# Altium schematic symbol library IC_ADI.SCHLIB: 3169 symbols (part 131 of 181)
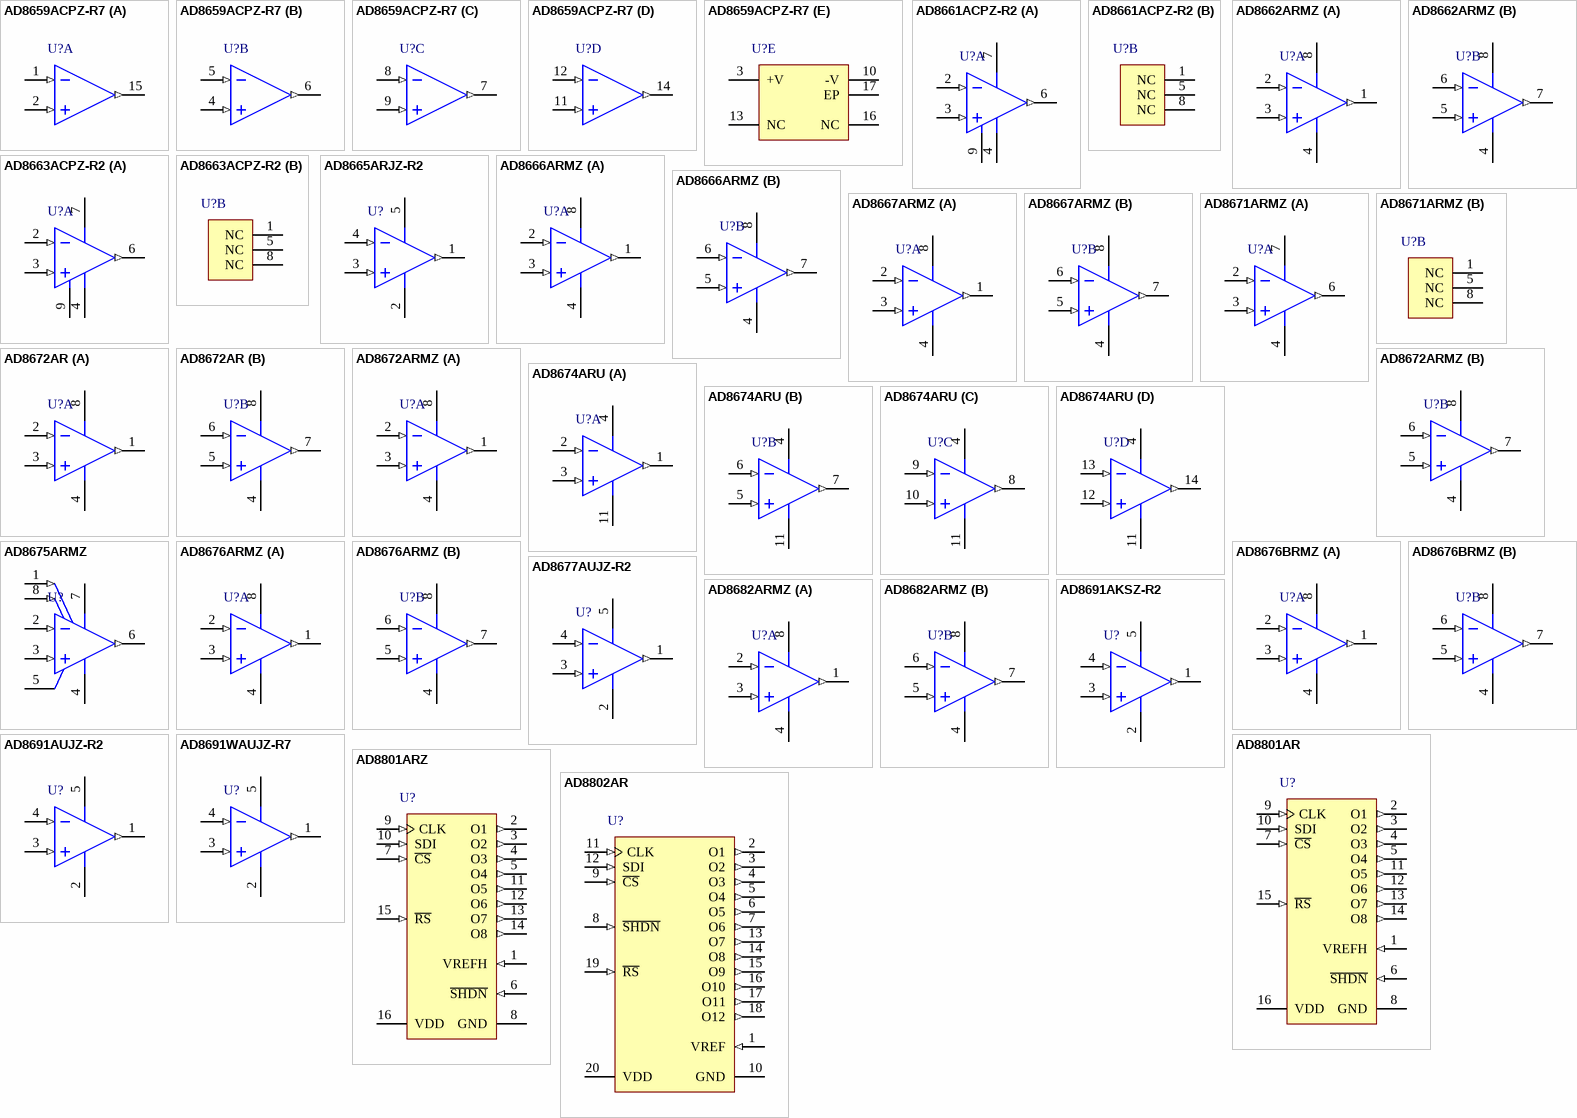
[diagram p321: symbols AD8659ACPZ-R7 to AD8802AR]

## AD8802AR
designator U?
Dual 8-Bit MDAC with Power Shutdown, -40 to +85 degC, RW-20, Tube; Generic Part Number: AD8802; PartNumber: AD8802AR; # DAC Outputs: 12; Max V+: 5.5V; Op Pwr Diss: 20mW; Resolution (Bits): 8; Settling Time: 600ns; Single Supply: Yes; DatasheetVersion: Rev.0; PackageVersion: 060706-A; PackageReference: RW-20; PackageDescription: 20-Lead Standard Small Outline Package [SOIC_W] Wide Body; Supplier Part Number 1: AD8802AR-ND; Supplier Part Number 2: 584-AD8802AR; Packing: Tube; RoHS: N; Mounting Technology: Surface Mount; Code_JEDEC: MS-013-AC; ComponentLink1Description: Manufacturer URL; ComponentLink2Description: Datasheet; ComponentLink3Description: Package Specification; ComponentLink4Description: Product URL
footprint SOIC20W_1.27 (Footprint not found)
pins: 1 VREF (in) "Common DAC Reference Input", 2 O1 (out) "DAC Output #1, addr = 0000", 3 O2 (out) "DAC Output #2, addr = 0001", 4 O3 (out) "DAC Output #3, addr = 0010", 5 O4 (out) "DAC Output #4, addr = 0011", 6 O5 (out) "DAC Output #5, addr = 0100", 7 O6 (out) "DAC Output #6, addr = 0101", 8 ~{SHDN} (in) "Reference input current goes to zero. DAC latch settings maintained", 9 ~{CS} (in) "Chip Select Input, Active Low. When C\S\ returns high, data in the serial input register is decoded based on the address bits and loaded into the target DAC register", 10 GND (power) "Ground", 11 CLK (in) "Serial Clock Input, Positive Edge Triggered", 12 SDI (in) "Serial Data Input", 13 O7 (out) "DAC Output #7, addr = 0110", 14 O8 (out) "DAC Output #8, addr = 0111", 15 O9 (out) "DAC Output #9, addr = 1000", 16 O10 (out) "DAC Output #10, addr = 1001", 17 O11 (out) "DAC Output #11, addr = 1010", 18 O12 (out) "DAC Output #12, addr = 1011", 19 ~{RS} (in) "Asynchronous Preset to Midscale Output Setting. Loads all DAC Registers with 80H", 20 VDD (power) "Positive Power Supply, Specified for Operation at Both +3 V and +5 V"

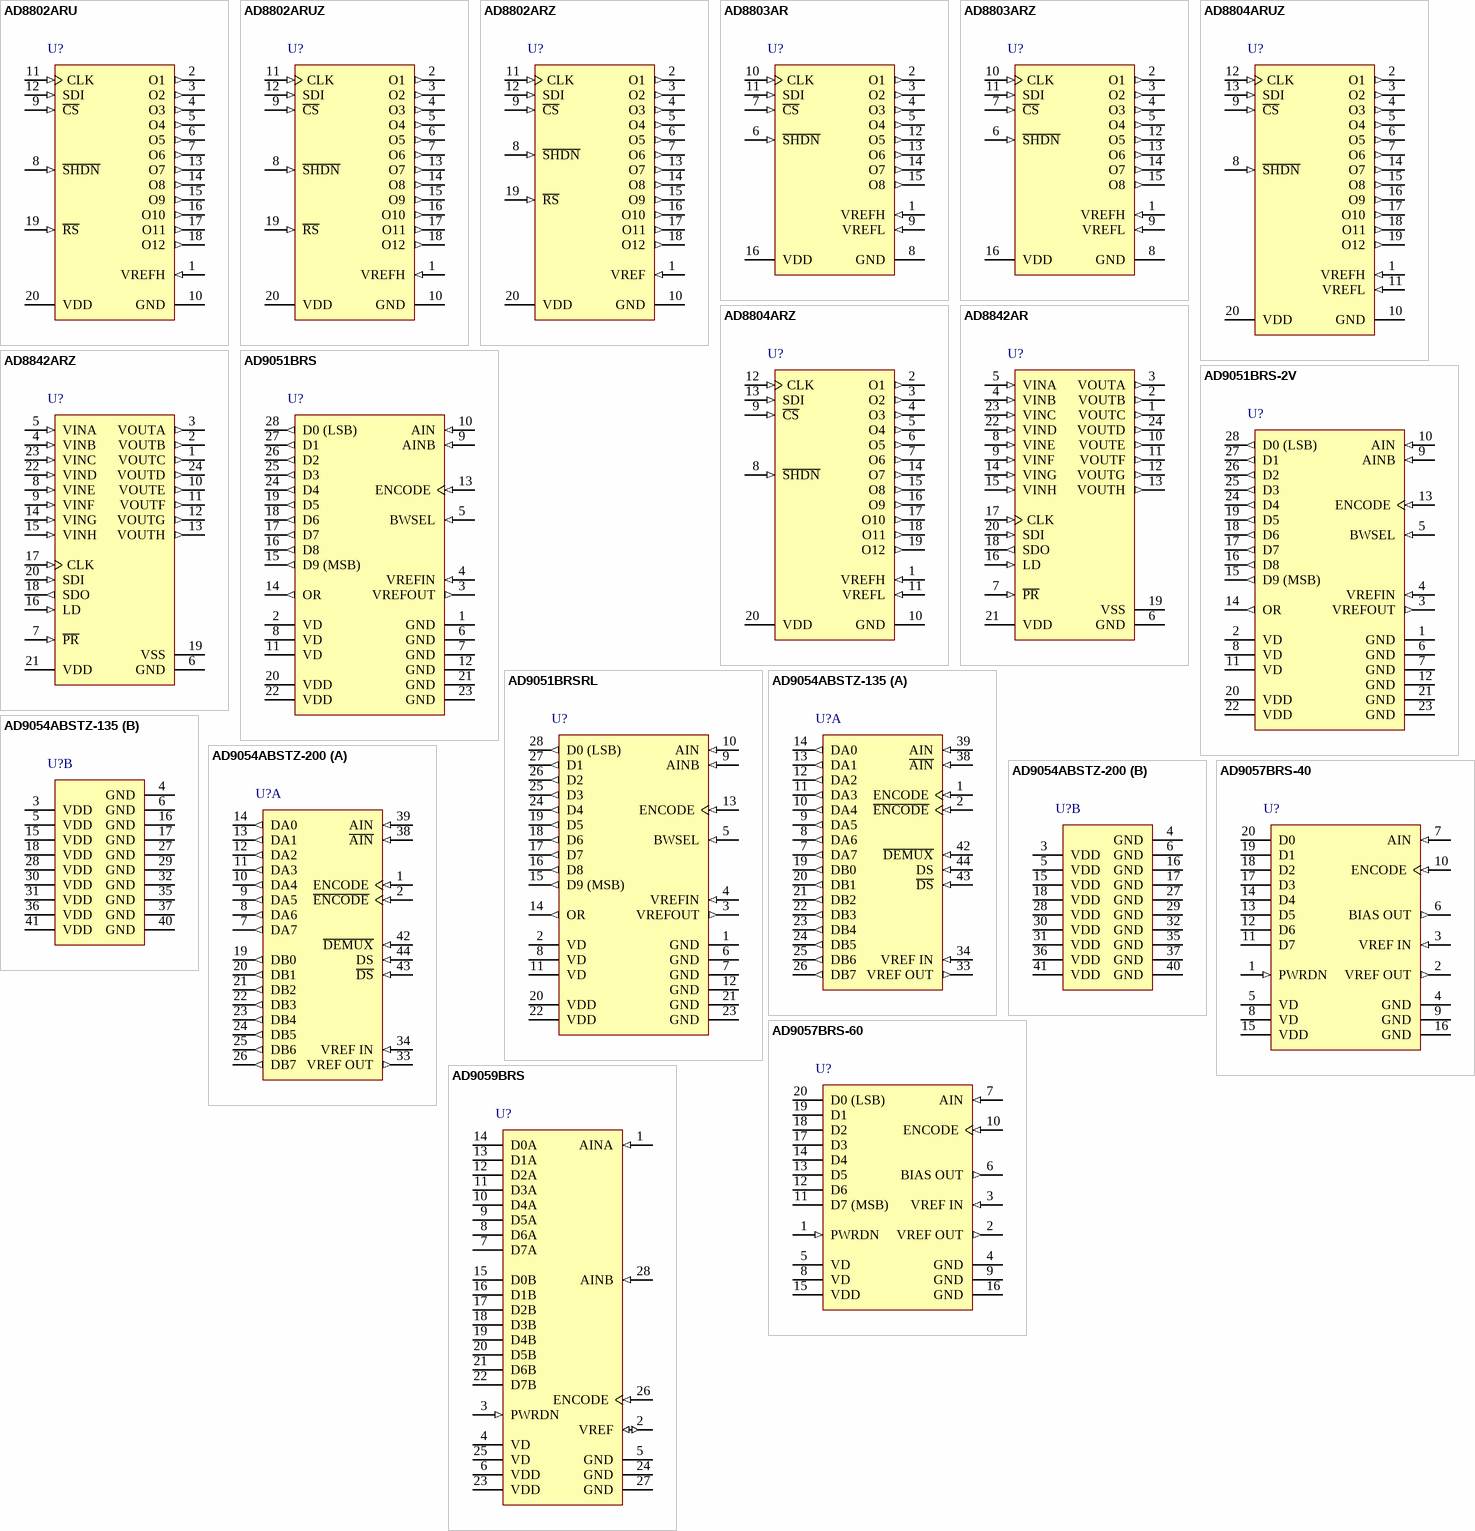
[diagram p101: symbols AD8802ARU to AD9059BRS]

## AD8802ARU
designator U?
Dual 8-Bit MDAC with Power Shutdown, -40 to +85 degC, RU-20, Tube; Generic Part Number: AD8802; PartNumber: AD8802ARU; # DAC Outputs: 12; Max V+: 5.5V; Op Pwr Diss: 20mW; Resolution (Bits): 8; Settling Time: 600ns; Single Supply: Yes; DatasheetVersion: Rev.0; PackageVersion: 2000; PackageReference: RU-20; PackageDescription: 20-Lead Thin Shrink Small Outline Package [TSSOP]; Supplier Part Number 1: AD8802ARU-ND; Supplier Part Number 2: 584-AD8802ARU; Packing: Tube; RoHS: N; Mounting Technology: Surface Mount; Code_JEDEC: MO-153AC; ComponentLink1Description: Manufacturer URL; ComponentLink2Description: Datasheet; ComponentLink3Description: Package Specification; ComponentLink4Description: Product URL
footprint TSSOP20_0.65 (Footprint not found)
pins: 1 VREFH (in) "Common DAC Reference Input", 2 O1 (out) "DAC Output #1, addr = 0000", 3 O2 (out) "DAC Output #2, addr = 0001", 4 O3 (out) "DAC Output #3, addr = 0010", 5 O4 (out) "DAC Output #4, addr = 0011", 6 O5 (out) "DAC Output #5, addr = 0100", 7 O6 (out) "DAC Output #6, addr = 0101", 8 ~{SHDN} (in) "Reference input current goes to zero. DAC latch settings maintained", 9 ~{CS} (in) "Chip Select Input, Active Low. When C\S\ returns high, data in the serial input register is decoded based on the address bits and loaded into the target DAC register", 10 GND (power) "Ground", 11 CLK (in) "Serial Clock Input, Positive Edge Triggered", 12 SDI (in) "Serial Data Input", 13 O7 (out) "DAC Output #7, addr = 0110", 14 O8 (out) "DAC Output #8, addr = 0111", 15 O9 (out) "DAC Output #9, addr = 1000", 16 O10 (out) "DAC Output #10, addr = 1001", 17 O11 (out) "DAC Output #11, addr = 1010", 18 O12 (out) "DAC Output #12, addr = 1011", 19 ~{RS} (in) "Asynchronous Preset to Midscale Output Setting. Loads all DAC Registers with 80H", 20 VDD (power) "Positive Power Supply, Specified for Operation at Both +3 V and +5 V"

## AD8802ARUZ
designator U?
Dual 8-Bit MDAC with Power Shutdown, -40 to +85 degC, RU-20, Pb-Free, Tube; Generic Part Number: AD8802; PartNumber: AD8802ARUZ; # DAC Outputs: 12; Max V+: 5.5V; Op Pwr Diss: 20mW; Resolution (Bits): 8; Settling Time: 600ns; Single Supply: Yes; DatasheetVersion: Rev.0; PackageVersion: 2000; PackageReference: RU-20; PackageDescription: 20-Lead Thin Shrink Small Outline Package [TSSOP]; Supplier Part Number 1: AD8802ARUZ-ND; Supplier Part Number 2: 59K7103; Supplier Part Number 3: 584-AD8802ARUZ; Packing: Tube; RoHS: Y; Mounting Technology: Surface Mount; Code_JEDEC: MO-153AC; ComponentLink1Description: Manufacturer URL; ComponentLink2Description: Datasheet; ComponentLink3Description: Package Specification; ComponentLink4Description: Product URL
footprint TSSOP20_0.65 (Footprint not found)
pins: 1 VREFH (in) "Common DAC Reference Input", 2 O1 (out) "DAC Output #1, addr = 0000", 3 O2 (out) "DAC Output #2, addr = 0001", 4 O3 (out) "DAC Output #3, addr = 0010", 5 O4 (out) "DAC Output #4, addr = 0011", 6 O5 (out) "DAC Output #5, addr = 0100", 7 O6 (out) "DAC Output #6, addr = 0101", 8 ~{SHDN} (in) "Reference input current goes to zero. DAC latch settings maintained", 9 ~{CS} (in) "Chip Select Input, Active Low. When C\S\ returns high, data in the serial input register is decoded based on the address bits and loaded into the target DAC register", 10 GND (power) "Ground", 11 CLK (in) "Serial Clock Input, Positive Edge Triggered", 12 SDI (in) "Serial Data Input", 13 O7 (out) "DAC Output #7, addr = 0110", 14 O8 (out) "DAC Output #8, addr = 0111", 15 O9 (out) "DAC Output #9, addr = 1000", 16 O10 (out) "DAC Output #10, addr = 1001", 17 O11 (out) "DAC Output #11, addr = 1010", 18 O12 (out) "DAC Output #12, addr = 1011", 19 ~{RS} (in) "Asynchronous Preset to Midscale Output Setting. Loads all DAC Registers with 80H", 20 VDD (power) "Positive Power Supply, Specified for Operation at Both +3 V and +5 V"

## AD8802ARZ
designator U?
Dual 8-Bit MDAC with Power Shutdown, -40 to +85 degC, RW-20, Pb-Free, Tube; Generic Part Number: AD8802; PartNumber: AD8802ARZ; # DAC Outputs: 12; Max V+: 5.5V; Op Pwr Diss: 20mW; Resolution (Bits): 8; Settling Time: 600ns; Single Supply: Yes; DatasheetVersion: Rev.0; PackageVersion: 060706-A; PackageReference: RW-20; PackageDescription: 20-Lead Standard Small Outline Package [SOIC_W] Wide Body; Supplier Part Number 1: AD8802ARZ-ND; Supplier Part Number 2: 59K7105; Supplier Part Number 3: 584-AD8802ARZ; Packing: Tube; RoHS: Y; Mounting Technology: Surface Mount; Code_JEDEC: MS-013-AC; ComponentLink1Description: Manufacturer URL; ComponentLink2Description: Datasheet; ComponentLink3Description: Package Specification; ComponentLink4Description: Product URL
footprint SOIC20W_1.27 (Footprint not found)
pins: 1 VREF (in) "Common DAC Reference Input", 2 O1 (out) "DAC Output #1, addr = 0000", 3 O2 (out) "DAC Output #2, addr = 0001", 4 O3 (out) "DAC Output #3, addr = 0010", 5 O4 (out) "DAC Output #4, addr = 0011", 6 O5 (out) "DAC Output #5, addr = 0100", 7 O6 (out) "DAC Output #6, addr = 0101", 8 ~{SHDN} (in) "Reference input current goes to zero. DAC latch settings maintained", 9 ~{CS} (in) "Chip Select Input, Active Low. When C\S\ returns high, data in the serial input register is decoded based on the address bits and loaded into the target DAC register", 10 GND (power) "Ground", 11 CLK (in) "Serial Clock Input, Positive Edge Triggered", 12 SDI (in) "Serial Data Input", 13 O7 (out) "DAC Output #7, addr = 0110", 14 O8 (out) "DAC Output #8, addr = 0111", 15 O9 (out) "DAC Output #9, addr = 1000", 16 O10 (out) "DAC Output #10, addr = 1001", 17 O11 (out) "DAC Output #11, addr = 1010", 18 O12 (out) "DAC Output #12, addr = 1011", 19 ~{RS} (in) "Asynchronous Preset to Midscale Output Setting. Loads all DAC Registers with 80H", 20 VDD (power) "Positive Power Supply, Specified for Operation at Both +3 V and +5 V"

## AD8803AR
designator U?
Octal 8-Bit MDAC with Power Shutdown, -40 to +85 degC, R-16, Tube; Generic Part Number: AD8803; PartNumber: AD8803AR; # DAC Outputs: 8; Max V+: 5.5V; Op Pwr Diss: 20mW; Settling Time: 600ns; Single Supply: Yes; DatasheetVersion: Rev.A; PackageVersion: 060606-A; PackageReference: R-16; PackageDescription: 16-Lead Standard Small Outline Package [SOIC_N] Narrow Body; Supplier Part Number 1: AD8803AR-ND; Supplier Part Number 2: 584-AD8803AR; Packing: Tube; Resolution (Bits): 8; RoHS: N; Mounting Technology: Surface Mount; Code_JEDEC: MS-012-AC; ComponentLink1Description: Manufacturer URL; ComponentLink2Description: Datasheet; ComponentLink3Description: Package Specification; ComponentLink4Description: Product URL
footprint SOIC16_1.27 (Footprint not found)
pins: 1 VREFH (in) "Common High-Side DAC Reference Input", 2 O1 (out) "DAC Output #1, Addr = 000.", 3 O2 (out) "DAC Output #2, Addr = 001.", 4 O3 (out) "DAC Output #3, Addr = 010.", 5 O4 (out) "DAC Output #4, Addr = 011.", 6 ~{SHDN} (in) "Reference inputs open circuit, active low, all DAC outputs open circuit. DAC latch settings maintained.", 7 ~{CS} (in) "Chip Select Input, active low. When C\S\ returns high, data in the serial input register is decoded based on the address bits and loaded into the target DAC register.", 8 GND (power) "Ground", 9 VREFL (in) "Common Low-Side DAC Reference Input", 10 CLK (in) "Serial Clock Input, Positive Edge Triggered", 11 SDI (in) "Serial Data Input", 12 O5 (out) "DAC Output #5, Addr = 100.", 13 O6 (out) "DAC Output #6, Addr = 101.", 14 O7 (out) "DAC Output #7, Addr = 110.", 15 O8 (out) "DAC Output #8, Addr = 111.", 16 VDD (power) "Positive power supply, specified for operation at both +3 V and +5 V."

## AD8803ARZ
designator U?
Octal 8-Bit MDAC with Power Shutdown, -40 to +85 degC, R-16, Pb-Free, Tube; Generic Part Number: AD8803; PartNumber: AD8803ARZ; # DAC Outputs: 8; Max V+: 5.5V; Op Pwr Diss: 20mW; Settling Time: 600ns; Single Supply: Yes; DatasheetVersion: Rev.A; PackageVersion: 060606-A; PackageReference: R-16; PackageDescription: 16-Lead Standard Small Outline Package [SOIC_N] Narrow Body; Supplier Part Number 1: AD8803ARZ-ND; Supplier Part Number 2: 1438630; Supplier Part Number 3: 59K7107; Supplier Part Number 4: 584-AD8803ARZ; Packing: Tube; Resolution (Bits): 8; RoHS: Y; Mounting Technology: Surface Mount; Code_JEDEC: MS-012-AC; ComponentLink1Description: Manufacturer URL; ComponentLink2Description: Datasheet; ComponentLink3Description: Package Specification; ComponentLink4Description: Product URL
footprint SOIC16_1.27 (Footprint not found)
pins: 1 VREFH (in) "Common High-Side DAC Reference Input", 2 O1 (out) "DAC Output #1, Addr = 000.", 3 O2 (out) "DAC Output #2, Addr = 001.", 4 O3 (out) "DAC Output #3, Addr = 010.", 5 O4 (out) "DAC Output #4, Addr = 011.", 6 ~{SHDN} (in) "Reference inputs open circuit, active low, all DAC outputs open circuit. DAC latch settings maintained.", 7 ~{CS} (in) "Chip Select Input, active low. When C\S\ returns high, data in the serial input register is decoded based on the address bits and loaded into the target DAC register.", 8 GND (power) "Ground", 9 VREFL (in) "Common Low-Side DAC Reference Input", 10 CLK (in) "Serial Clock Input, Positive Edge Triggered", 11 SDI (in) "Serial Data Input", 12 O5 (out) "DAC Output #5, Addr = 100.", 13 O6 (out) "DAC Output #6, Addr = 101.", 14 O7 (out) "DAC Output #7, Addr = 110.", 15 O8 (out) "DAC Output #8, Addr = 111.", 16 VDD (power) "Positive power supply, specified for operation at both +3 V and +5 V."

## AD8804ARUZ
designator U?
Dual 8-Bit MDAC with Power Shutdown, -40 to +85 degC, RU-20, Pb-Free, Tube; Generic Part Number: AD8804; PartNumber: AD8804ARUZ; # DAC Outputs: 12; Max V+: 5.5V; Op Pwr Diss: 20mW; Resolution (Bits): 8; Settling Time: 600ns; Single Supply: Yes; DatasheetVersion: Rev.0; PackageVersion: 2000; PackageReference: RU-20; PackageDescription: 20-Lead Thin Shrink Small Outline Package [TSSOP]; Supplier Part Number 1: AD8804ARUZ-ND; Supplier Part Number 2: 584-AD8804ARUZ; Packing: Tube; RoHS: Y; Mounting Technology: Surface Mount; Code_JEDEC: MO-153AC; ComponentLink1Description: Manufacturer URL; ComponentLink2Description: Datasheet; ComponentLink3Description: Package Specification; ComponentLink4Description: Product URL
footprint TSSOP20_0.65 (Footprint not found)
pins: 1 VREFH (in) "Common High-Side DAC Reference Input", 2 O1 (out) "DAC Output #1, addr = 0000", 3 O2 (out) "DAC Output #2, addr = 0001", 4 O3 (out) "DAC Output #3, addr = 0010", 5 O4 (out) "DAC Output #4, addr = 0011", 6 O5 (out) "DAC Output #5, addr = 0100", 7 O6 (out) "DAC Output #6, addr = 0101", 8 ~{SHDN} (in) "Reference input current goes to zero. DAC latch settings maintained", 9 ~{CS} (in) "Chip Select Input, Active Low. When C\S\ returns high, data in the serial input register is decoded based on the address bits and loaded into the target DAC register", 10 GND (power) "Ground", 11 VREFL (in) "Common Low-Side DAC Reference Input", 12 CLK (in) "Serial Clock Input, Positive Edge Triggered", 13 SDI (in) "Serial Data Input", 14 O7 (out) "DAC Output #7, addr = 0110", 15 O8 (out) "DAC Output #8, addr = 0111", 16 O9 (out) "DAC Output #9, addr = 1000", 17 O10 (out) "DAC Output #10, addr = 1001", 18 O11 (out) "DAC Output #11, addr = 1010", 19 O12 (out) "DAC Output #12, addr = 1011", 20 VDD (power) "Positive Power Supply, Specified for Operation at Both +3 V and +5 V"

## AD8804ARZ
designator U?
Dual 8-Bit MDAC with Power Shutdown, -40 to +85 degC, RW-20, Pb-Free, Tube; Generic Part Number: AD8804; PartNumber: AD8804ARZ; # DAC Outputs: 12; Max V+: 5.5V; Op Pwr Diss: 20mW; Resolution (Bits): 8; Settling Time: 600ns; Single Supply: Yes; DatasheetVersion: Rev.0; PackageVersion: 060706-A; PackageReference: RW-20; PackageDescription: 20-Lead Standard Small Outline Package [SOIC_W] Wide Body; Supplier Part Number 1: AD8804ARZ-ND; Supplier Part Number 2: 2312813; Supplier Part Number 3: 59K7111; Supplier Part Number 4: 584-AD8804ARZ; Packing: Tube; RoHS: Y; Mounting Technology: Surface Mount; Code_JEDEC: MS-013-AC; ComponentLink1Description: Manufacturer URL; ComponentLink2Description: Datasheet; ComponentLink3Description: Package Specification; ComponentLink4Description: Product URL
footprint SOIC20W_1.27 (Footprint not found)
pins: 1 VREFH (in) "Common High-Side DAC Reference Input", 2 O1 (out) "DAC Output #1, addr = 0000", 3 O2 (out) "DAC Output #2, addr = 0001", 4 O3 (out) "DAC Output #3, addr = 0010", 5 O4 (out) "DAC Output #4, addr = 0011", 6 O5 (out) "DAC Output #5, addr = 0100", 7 O6 (out) "DAC Output #6, addr = 0101", 8 ~{SHDN} (in) "Reference input current goes to zero. DAC latch settings maintained", 9 ~{CS} (in) "Chip Select Input, Active Low. When C\S\ returns high, data in the serial input register is decoded based on the address bits and loaded into the target DAC register", 10 GND (power) "Ground", 11 VREFL (in) "Common Low-Side DAC Reference Input", 12 CLK (in) "Serial Clock Input, Positive Edge Triggered", 13 SDI (in) "Serial Data Input", 14 O7 (out) "DAC Output #7, addr = 0110", 15 O8 (out) "DAC Output #8, addr = 0111", 16 O9 (out) "DAC Output #9, addr = 1000", 17 O10 (out) "DAC Output #10, addr = 1001", 18 O11 (out) "DAC Output #11, addr = 1010", 19 O12 (out) "DAC Output #12, addr = 1011", 20 VDD (power) "Positive Power Supply, Specified for Operation at Both +3 V and +5 V"

## AD8842AR
designator U?
Octal 8-Bit CMOS MDAC, -40 to +85 degC, RW-24, Tube; Generic Part Number: AD8842; PartNumber: AD8842AR; # DAC Outputs: 8; Max V+: 5.25V; Op Pwr Diss: 135mW; Settling Time: 2.9祍; Single Supply: No; DatasheetVersion: Rev.A; PackageVersion: 060706-A; PackageReference: RW-24; PackageDescription: 24-Lead Standard Small Outline Package [SOIC_W]; Supplier Part Number 1: AD8842AR-ND; Supplier Part Number 2: 584-AD8842AR; Packing: Tube; Resolution (Bits): 8; RoHS: N; Mounting Technology: Surface Mount; Code_JEDEC: MS-013-AD; ComponentLink1Description: Manufacturer URL; ComponentLink2Description: Datasheet; ComponentLink3Description: Package Specification; ComponentLink4Description: Product URL
footprint SOIC24W_1.27 (Footprint not found)
pins: 1 VOUTC (out) "DAC C Output", 2 VOUTB (out) "DAC B Output", 3 VOUTA (out) "DAC A Output", 4 VINB (in) "DAC B Reference Input", 5 VINA (in) "DAC A Reference Input", 6 GND (power) "Ground", 7 ~{PR} (in) "Preset Input, active low, all DAC registers=80H", 8 VINE (in) "DAC E Reference Input", 9 VINF (in) "DAC F Reference Input", 10 VOUTE (out) "DAC E Output", 11 VOUTF (out) "DAC F Output", 12 VOUTG (out) "DAC G Output", 13 VOUTH (out) "DAC H Output", 14 VING (in) "DAC G Reference Input", 15 VINH (in) "DAC H Reference Input", 16 LD (in) "Load DAC Register Strobe, active-high input that transfers the data bits from the serial-input register into the decoded DAC register. SDI and CLK inputs are disabled when LD is high. See Tables I and II", 17 CLK (in) "Serial Clock Input, positive edge triggered", 18 SDO (out) "Serial Data Output, active totem pole output", 19 VSS (power) "Negative 5 V Power Supply", 20 SDI (in) "Serial Data Input", 21 VDD (power) "Positive 5 V Power Supply", 22 VIND (in) "DAC D Reference Input", 23 VINC (in) "DAC C Reference Input", 24 VOUTD (out) "DAC D Output"

## AD8842ARZ
designator U?
Octal 8-Bit CMOS MDAC, -40 to +85 degC, RW-24, Pb-Free, Tube; Generic Part Number: AD8842; PartNumber: AD8842ARZ; # DAC Outputs: 8; Max V+: 5.25V; Op Pwr Diss: 135mW; Settling Time: 2.9祍; Single Supply: No; DatasheetVersion: Rev.A; PackageVersion: 060706-A; PackageReference: RW-24; PackageDescription: 24-Lead Standard Small Outline Package [SOIC_W]; Supplier Part Number 1: AD8842ARZ-ND; Supplier Part Number 2: 2305695; Supplier Part Number 3: 59K7113; Supplier Part Number 4: 584-AD8842ARZ; Packing: Tube; Resolution (Bits): 8; RoHS: Y; Mounting Technology: Surface Mount; Code_JEDEC: MS-013-AD; ComponentLink1Description: Manufacturer URL; ComponentLink2Description: Datasheet; ComponentLink3Description: Package Specification; ComponentLink4Description: Product URL
footprint SOIC24W_1.27 (Footprint not found)
pins: 1 VOUTC (out) "DAC C Output", 2 VOUTB (out) "DAC B Output", 3 VOUTA (out) "DAC A Output", 4 VINB (in) "DAC B Reference Input", 5 VINA (in) "DAC A Reference Input", 6 GND (power) "Ground", 7 ~{PR} (in) "Preset Input, active low, all DAC registers=80H", 8 VINE (in) "DAC E Reference Input", 9 VINF (in) "DAC F Reference Input", 10 VOUTE (out) "DAC E Output", 11 VOUTF (out) "DAC F Output", 12 VOUTG (out) "DAC G Output", 13 VOUTH (out) "DAC H Output", 14 VING (in) "DAC G Reference Input", 15 VINH (in) "DAC H Reference Input", 16 LD (in) "Load DAC Register Strobe, active-high input that transfers the data bits from the serial-input register into the decoded DAC register. SDI and CLK inputs are disabled when LD is high. See Tables I and II", 17 CLK (in) "Serial Clock Input, positive edge triggered", 18 SDO (out) "Serial Data Output, active totem pole output", 19 VSS (power) "Negative 5 V Power Supply", 20 SDI (in) "Serial Data Input", 21 VDD (power) "Positive 5 V Power Supply", 22 VIND (in) "DAC D Reference Input", 23 VINC (in) "DAC C Reference Input", 24 VOUTD (out) "DAC D Output"

## AD9051BRS
designator U?
Single 10-Bit Analog-to-Digital Converter with Parallel Interface, 60MSPS, -40 to +85 degC, RS-28, Tube; Generic Part Number: AD9051; PartNumber: AD9051BRS; Resolution (Bits): 10; Channels: 1; Throughput Rate (SPS): 60M; Interface: Par; DatasheetVersion: Rev.C; PackageVersion: 060106-A; PackageReference: RS-28; PackageDescription: 28-Lead Shrink Small Outline Package [SSOP]; Supplier Part Number 1: AD9051BRS-ND; RoHS: N; Packing: Tube; Mounting Technology: Surface Mount; Code_JEDEC: MO-150-AH; ComponentLink1Description: Manufacturer URL; ComponentLink2Description: Datasheet; ComponentLink3Description: Package Specification; ComponentLink4Description: Product URL
footprint SSOP28_0.65 (Footprint not found)
pins: 1 GND (power) "Ground", 2 VD (power) "Analog 5 V Power Supply", 3 VREFOUT (out) "Internal Bandgap Voltage Reference (Nominally 2.5 V)", 4 VREFIN (in) "Input to Reference Amplifier. Voltage reference for ADC is connected here.", 5 BWSEL (in) "Bandwidth Select. NC = 130 MHz nominal. +VD = 50 MHz nominal.", 6 GND (power) "Ground", 7 GND (power) "Ground", 8 VD (power) "Analog 5 V Power Supply", 9 AINB (in) "Complementary Analog Input Pin (Analog Input Bar)", 10 AIN (in) "Analog Input Pin", 11 VD (power) "Analog 5 V Power Supply", 12 GND (power) "Ground", 13 ENCODE (in) "Encode Clock Input to ADC. Internal T/H is placed in hold mode (ADC is encoding) on rising edge of encode signal.", 14 OR (out) "Out of Range Signal. Logic 0 when analog input is in nominal range. Logic 1 when analog input is out of nominal range", 15 D9 (MSB) (out) "Most Significant Bit of ADC Output", 16 D8 (out) "Digital Output Bits of ADC", 17 D7 (out) "Digital Output Bits of ADC", 18 D6 (out) "Digital Output Bits of ADC", 19 D5 (out) "Digital Output Bits of ADC", 20 VDD (power) "Digital Output Power Supply (Only Used by Digital Outputs)", 21 GND (power) "Ground", 22 VDD (power) "Digital Output Power Supply (Only Used by Digital Outputs)", 23 GND (power) "Ground", 24 D4 (out) "Digital Output Bits of ADC", 25 D3 (out) "Digital Output Bits of ADC", 26 D2 (out) "Digital Output Bits of ADC", 27 D1 (out) "Digital Output Bits of ADC", 28 D0 (LSB) (out) "Least Significant Bit of ADC Output"

## AD9051BRS-2V
designator U?
Single 10-Bit Analog-to-Digital Converter with Parallel Interface, 60MSPS, -40 to +85 degC, RS-28, Tube; Generic Part Number: AD9051; PartNumber: AD9051BRS-2V; Resolution (Bits): 10; Channels: 1; Throughput Rate (SPS): 60M; Interface: Par; DatasheetVersion: Rev.C; PackageVersion: 060106-A; PackageReference: RS-28; PackageDescription: 28-Lead Shrink Small Outline Package [SSOP]; Supplier Part Number 1: AD9051BRS-2V-ND; Supplier Part Number 2: 09B6750; RoHS: N; Packing: Tube; Mounting Technology: Surface Mount; Code_JEDEC: MO-150-AH; ComponentLink1Description: Manufacturer URL; ComponentLink2Description: Datasheet; ComponentLink3Description: Package Specification; ComponentLink4Description: Product URL
footprint SSOP28_0.65 (Footprint not found)
pins: 1 GND (power) "Ground", 2 VD (power) "Analog 5 V Power Supply", 3 VREFOUT (out) "Internal Bandgap Voltage Reference (Nominally 2.5 V)", 4 VREFIN (in) "Input to Reference Amplifier. Voltage reference for ADC is connected here.", 5 BWSEL (in) "Bandwidth Select. NC = 130 MHz nominal. +VD = 50 MHz nominal.", 6 GND (power) "Ground", 7 GND (power) "Ground", 8 VD (power) "Analog 5 V Power Supply", 9 AINB (in) "Complementary Analog Input Pin (Analog Input Bar)", 10 AIN (in) "Analog Input Pin", 11 VD (power) "Analog 5 V Power Supply", 12 GND (power) "Ground", 13 ENCODE (in) "Encode Clock Input to ADC. Internal T/H is placed in hold mode (ADC is encoding) on rising edge of encode signal.", 14 OR (out) "Out of Range Signal. Logic 0 when analog input is in nominal range. Logic 1 when analog input is out of nominal range", 15 D9 (MSB) (out) "Most Significant Bit of ADC Output", 16 D8 (out) "Digital Output Bits of ADC", 17 D7 (out) "Digital Output Bits of ADC", 18 D6 (out) "Digital Output Bits of ADC", 19 D5 (out) "Digital Output Bits of ADC", 20 VDD (power) "Digital Output Power Supply (Only Used by Digital Outputs)", 21 GND (power) "Ground", 22 VDD (power) "Digital Output Power Supply (Only Used by Digital Outputs)", 23 GND (power) "Ground", 24 D4 (out) "Digital Output Bits of ADC", 25 D3 (out) "Digital Output Bits of ADC", 26 D2 (out) "Digital Output Bits of ADC", 27 D1 (out) "Digital Output Bits of ADC", 28 D0 (LSB) (out) "Least Significant Bit of ADC Output"

## AD9051BRSRL
designator U?
Single 10-Bit Analog-to-Digital Converter with Parallel Interface, 60MSPS, -40 to +85 degC, RS-28, Reel; Generic Part Number: AD9051; PartNumber: AD9051BRSRL; Resolution (Bits): 10; Channels: 1; Throughput Rate (SPS): 60M; Interface: Par; DatasheetVersion: Rev.C; PackageVersion: 060106-A; PackageReference: RS-28; PackageDescription: 28-Lead Shrink Small Outline Package [SSOP]; Supplier Part Number 1: AD9051BRSRL-ND; RoHS: N; Packing: Reel; Mounting Technology: Surface Mount; Code_JEDEC: MO-150-AH; ComponentLink1Description: Manufacturer URL; ComponentLink2Description: Datasheet; ComponentLink3Description: Package Specification; ComponentLink4Description: Product URL
footprint SSOP28_0.65 (Footprint not found)
pins: 1 GND (power) "Ground", 2 VD (power) "Analog 5 V Power Supply", 3 VREFOUT (out) "Internal Bandgap Voltage Reference (Nominally 2.5 V)", 4 VREFIN (in) "Input to Reference Amplifier. Voltage reference for ADC is connected here.", 5 BWSEL (in) "Bandwidth Select. NC = 130 MHz nominal. +VD = 50 MHz nominal.", 6 GND (power) "Ground", 7 GND (power) "Ground", 8 VD (power) "Analog 5 V Power Supply", 9 AINB (in) "Complementary Analog Input Pin (Analog Input Bar)", 10 AIN (in) "Analog Input Pin", 11 VD (power) "Analog 5 V Power Supply", 12 GND (power) "Ground", 13 ENCODE (in) "Encode Clock Input to ADC. Internal T/H is placed in hold mode (ADC is encoding) on rising edge of encode signal.", 14 OR (out) "Out of Range Signal. Logic 0 when analog input is in nominal range. Logic 1 when analog input is out of nominal range", 15 D9 (MSB) (out) "Most Significant Bit of ADC Output", 16 D8 (out) "Digital Output Bits of ADC", 17 D7 (out) "Digital Output Bits of ADC", 18 D6 (out) "Digital Output Bits of ADC", 19 D5 (out) "Digital Output Bits of ADC", 20 VDD (power) "Digital Output Power Supply (Only Used by Digital Outputs)", 21 GND (power) "Ground", 22 VDD (power) "Digital Output Power Supply (Only Used by Digital Outputs)", 23 GND (power) "Ground", 24 D4 (out) "Digital Output Bits of ADC", 25 D3 (out) "Digital Output Bits of ADC", 26 D2 (out) "Digital Output Bits of ADC", 27 D1 (out) "Digital Output Bits of ADC", 28 D0 (LSB) (out) "Least Significant Bit of ADC Output"

## AD9054ABSTZ-135
designator U?
Single 8-Bit Analog-to-Digital Converter with Parallel Interface, 135MSPS, -40 to +85 degC, ST-44-1, Pb-Free, Tray; Generic Part Number: AD9054A-135; PartNumber: AD9054ABSTZ-135; Resolution (Bits): 8; Channels: 1; Throughput Rate (SPS): 135M; Interface: Par; DatasheetVersion: Rev.D; PackageVersion: 051706-A; PackageReference: ST-44-1; PackageDescription: 44-Lead Low Profile Quad Flat Package [LQFP]; Supplier Part Number 1: AD9054ABSTZ-135-ND; Supplier Part Number 2: 584-AD9054ABSTZ-135; RoHS: Y; Packing: Tray; Mounting Technology: Surface Mount; ComponentLink1Description: Manufacturer URL; ComponentLink2Description: Datasheet; ComponentLink3Description: Package Specification; ComponentLink4Description: Product URL
footprint LQFP44_0.8mm (Footprint not found)
part A pins: 1 ENCODE (in) "Encode Clock for ADC (ADC Samples on Rising Edge of ENCODE)", 2 ~{ENCODE} (in) "Encode Clock Complement (ADC Samples on Falling Edge of E\N\C\O\D\E\)", 7 DA7 (out) "Digital Outputs of ADC Channel A. DA7 is the MSB, DA0 the LSB", 8 DA6 (out) "Digital Outputs of ADC Channel A. DA7 is the MSB, DA0 the LSB", 9 DA5 (out) "Digital Outputs of ADC Channel A. DA7 is the MSB, DA0 the LSB", 10 DA4 (out) "Digital Outputs of ADC Channel A. DA7 is the MSB, DA0 the LSB", 11 DA3 (out) "Digital Outputs of ADC Channel A. DA7 is the MSB, DA0 the LSB", 12 DA2 (out) "Digital Outputs of ADC Channel A. DA7 is the MSB, DA0 the LSB", 13 DA1 (out) "Digital Outputs of ADC Channel A. DA7 is the MSB, DA0 the LSB", 14 DA0 (out) "Digital Outputs of ADC Channel A. DA7 is the MSB, DA0 the LSB", 19 DB0 (out) "Digital Outputs of ADC Channel B. DB7 is the MSB, DB0 the LSB", 20 DB1 (out) "Digital Outputs of ADC Channel B. DB7 is the MSB, DB0 the LSB", 21 DB2 (out) "Digital Outputs of ADC Channel B. DB7 is the MSB, DB0 the LSB", 22 DB3 (out) "Digital Outputs of ADC Channel B. DB7 is the MSB, DB0 the LSB", 23 DB4 (out) "Digital Outputs of ADC Channel B. DB7 is the MSB, DB0 the LSB", 24 DB5 (out) "Digital Outputs of ADC Channel B. DB7 is the MSB, DB0 the LSB", 25 DB6 (out) "Digital Outputs of ADC Channel B. DB7 is the MSB, DB0 the LSB", 26 DB7 (out) "Digital Outputs of ADC Channel B. DB7 is the MSB, DB0 the LSB", 33 VREF OUT (out) "Internal Reference Output (2.5 V typical); Bypass with 0.1 uF to Ground", 34 VREF IN (in) "Reference Input for ADC (2.5 V typical, +/-4%)", 38 ~{AIN} (in) "Analog Input--Complement. Connect to input signal midscale reference.", 39 AIN (in) "Analog Input--True", 42 ~{DEMUX} (in) "Format Select. LOW = Dual. Channel Mode, HIGH = Single. Channel Mode (Channel A Only)", 43 ~{DS} (in) "Data Sync Complement", 44 DS (in) "Data Sync--Aligns Output Channels in Dual-Channel Mode"
part B pins: 3 VDD (power) "Power Supply (5 V)", 4 GND (power) "Ground", 5 VDD (power) "Power Supply (5 V)", 6 GND (power) "Ground", 15 VDD (power) "Power Supply (5 V)", 16 GND (power) "Ground", 17 GND (power) "Ground", 18 VDD (power) "Power Supply (5 V)", 27 GND (power) "Ground", 28 VDD (power) "Power Supply (5 V)", 29 GND (power) "Ground", 30 VDD (power) "Power Supply (5 V)", 31 VDD (power) "Power Supply (5 V)", 32 GND (power) "Ground", 35 GND (power) "Ground", 36 VDD (power) "Power Supply (5 V)", 37 GND (power) "Ground", 40 GND (power) "Ground", 41 VDD (power) "Power Supply (5 V)"
